# Altium footprint library ICs.PcbLib: 29 footprints (part 1 of 2)
Each footprint in its own frame and in the unit in brackets; x right, y up, seen from the top. Pads: shape width x height; smd on the part's side, far side on the other; paste and mask are expansions set on the pad; w line width, h text height; cw(c..) or ccw(c..) is an arc to the next point about the centre after c.
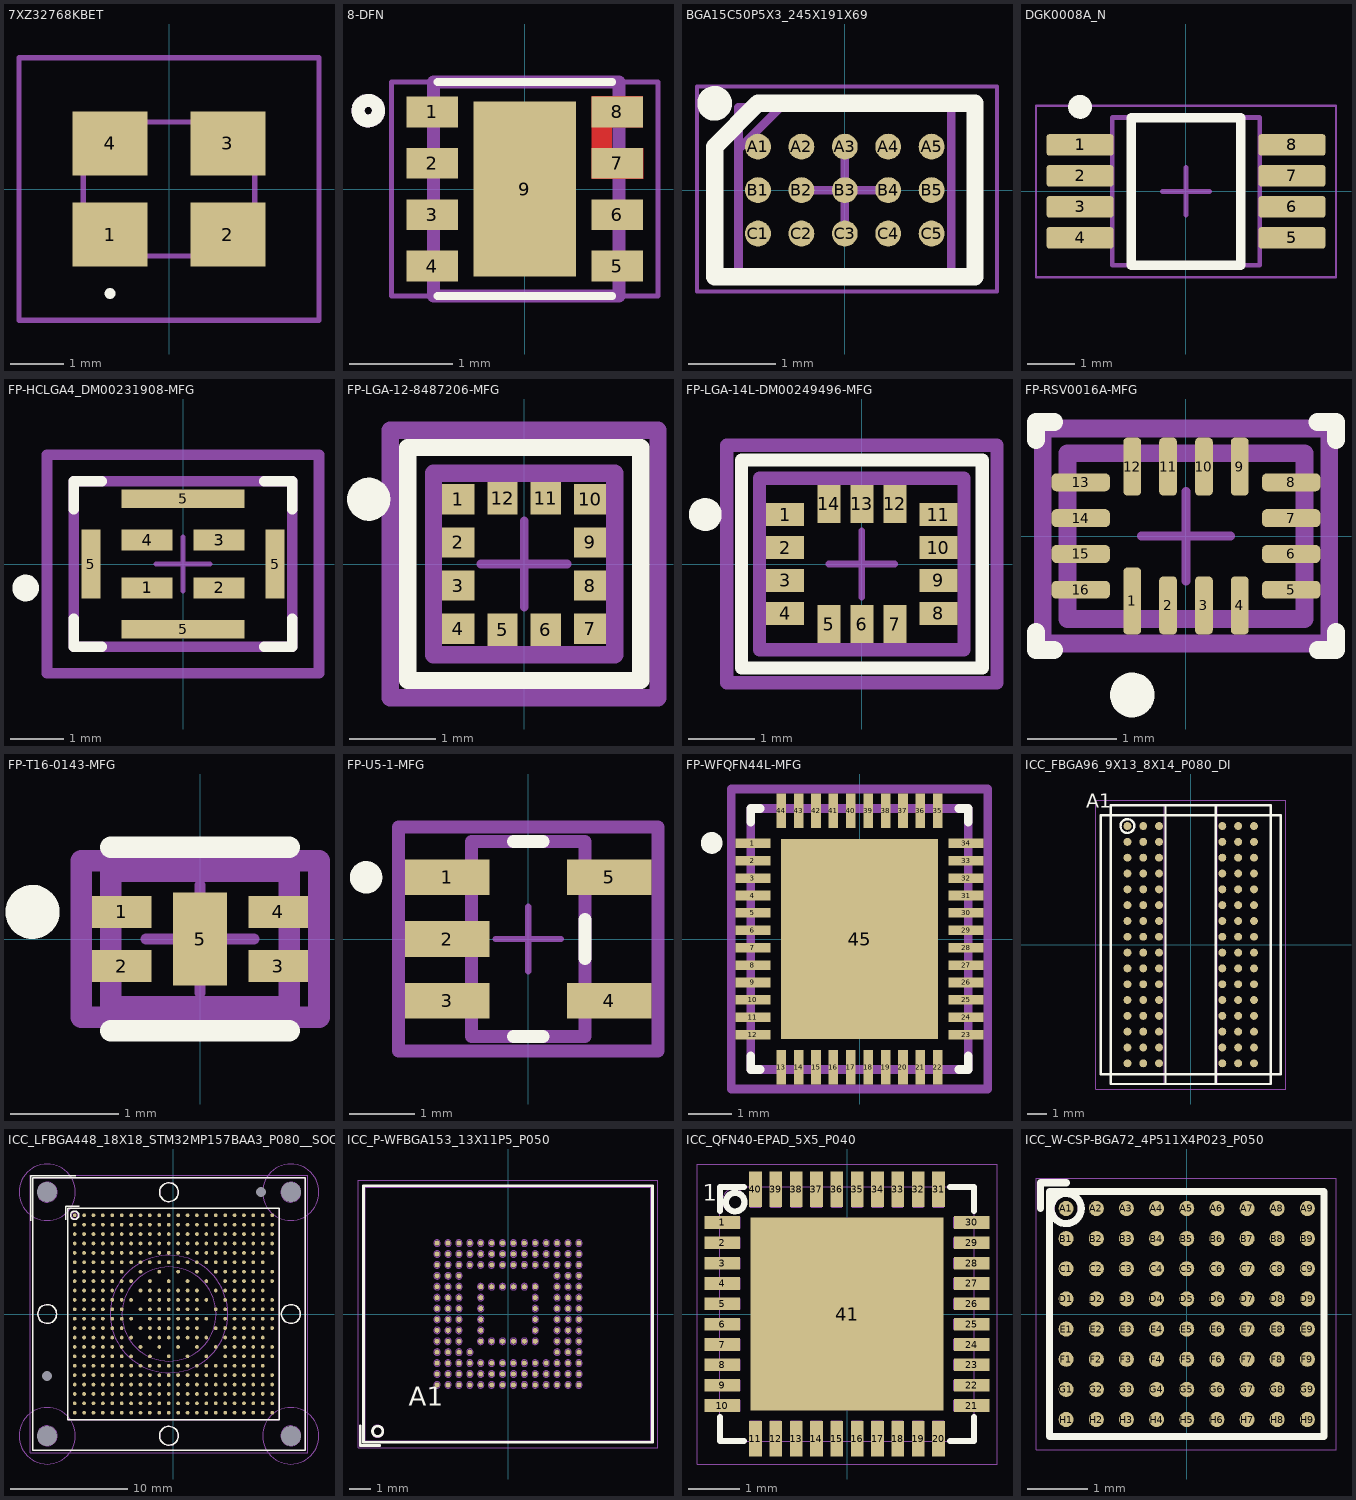
[diagram p0: the footprints below, top view; thin cyan lines are the x and y axes]

## 7XZ32768KBET [mm]
pads (4):
  rect 1.4x1.2 smd: 1(-1.1,-0.85) 2(1.1,-0.85) 3(1.1,0.85) 4(-1.1,0.85)
Top Overlay:
  lines w0.1: -1.1,-2 ccw(c-1.1,-1.95) -1.1,-1.9 ccw(c-1.1,-1.95) -1.1,-2
Mechanical 13:
  lines w0.1: -1.6,-1.25 1.6,-1.25 1.6,1.25 -1.6,1.25 -1.6,-1.25
Mechanical 15:
  lines w0.1: -2.8,-2.45 2.8,-2.45 2.8,2.45 -2.8,2.45 -2.8,-2.45
3D body "7XZ-32.768KBE-T.stp": height 1.2, standoff 0, extent -1.68,-1.33 1.68,1.33

## 8-DFN [mm]
pads (9):
  rect 0.5x0.3 smd mask+0.05: 1(-0.9,0.75) 2(-0.9,0.25) 3(-0.9,-0.25) 4(-0.9,-0.75) 5(0.9,-0.75) 6(0.9,-0.25) 7(0.9,0.25) 8(0.9,0.75)
  rect 1x1.7 smd paste-2 mask+0.05: 9(0,0)
Top Layer:
  region: 1.149,0.9 1.149,0.599 0.847,0.599 0.847,0.398 1.15,0.398 1.15,0.102 0.65,0.102 0.65,0.9
Top Overlay:
  circle w0.127: c-1.522,0.762 r0.1
  lines w0.075: -0.85,-1.04 0.85,-1.04 ; -0.85,1.04 0.85,1.04
Mechanical 13:
  circle w0.127: c-1.522,0.762 r0.1
  lines w0.127: -0.889,-1.041 0.914,-1.041 0.914,1.041 -0.889,1.041 -0.889,-1.041
Mechanical 15:
  lines w0.05: -1.295,-1.041 -1.295,1.041 1.295,1.041 1.295,-1.041 -1.295,-1.041
3D body "DFN-8.STEP": height 1.01, standoff 0.01, extent -0.984,-1.001 1.016,0.999

## BGA15C50P5X3_245X191X69 [mm]
pads (15):
  round 0.298 smd mask+0.051: A1(-1,0.5) A2(-0.5,0.5) A3(0,0.5) A4(0.5,0.5) A5(1,0.5) B1(-1,0) B2(-0.5,0) B3(0,0) B4(0.5,0) B5(1,0) C1(-1,-0.5) C2(-0.5,-0.5) C3(0,-0.5) C4(0.5,-0.5) C5(1,-0.5)
Top Overlay:
  circle w0.2: c-1.499,0.999 r0.1
  lines w0.2: -1.499,-0.999 -1.499,0.5 -1,0.999 1.499,0.999 1.499,-0.999 -1.499,-0.999
Top Courtyard:
  lines w0.05: -1.702,-1.168 -1.702,1.194 1.753,1.194 1.753,-1.168 -1.702,-1.168
Top Component Center:
  lines w0.1: -0.5,0 0.5,0 ; 0,-0.5 0,0.5
Top Assembly:
  lines w0.1: -1.224,0.471 -0.741,0.954 ; -1.224,-0.954 -1.224,0.954 1.224,0.954 1.224,-0.954 -1.224,-0.954
  text ".Designator" at 0,0.188 h1
3D body "MAX17330X22+.stp": height 0.69, standoff 0, extent -1.224,-0.954 1.224,0.954

## DGK0008A_N [mm] "TSOP, 8-Leads, Body 3.1x3.1mm, Pitch 0.65mm, IPC Medium Density"
height 1.1
pads (8):
  rrect22% 1.4x0.45 smd mask+0.051: 1(-2.225,0.975) 2(-2.225,0.325) 3(-2.225,-0.325) 4(-2.225,-0.975) 5(2.225,-0.975) 6(2.225,-0.325) 7(2.225,0.325) 8(2.225,0.975)
Top Overlay:
  circle w0.25: c-2.225,1.775 r0.125
  lines w0.2: -1.15,-1.55 1.15,-1.55 1.15,1.55 -1.15,1.55 -1.15,-1.55
Mechanical 1:
  text ".Designator" at -1.397,-0.254 h0.7
Mechanical 13:
  lines w0.1: -1.55,-1.55 1.55,-1.55 1.55,1.55 -1.55,1.55 -1.55,-1.55
Mechanical 15:
  lines w0.05: -3.15,-1.8 3.15,-1.8 3.15,1.8 -3.15,1.8 -3.15,-1.8
  lines w0.1: -0.5,0 0.5,0 ; 0,-0.5 0,0.5
3D body "MUY08A_ASM.stp": height 0.94, standoff -0.02, extent -2.451,-1.499 2.451,1.499

## FP-HCLGA4_DM00231908-MFG [mm]
pads (8):
  rect 0.95x0.4 smd paste+0 mask+0.102: 1(-0.675,-0.45) 2(0.675,-0.45) 3(0.675,0.45) 4(-0.675,0.45)
  rect 0.35x1.3 smd paste+0 mask+0.102: 5(-1.725,0) 5(1.725,0)
  rect 2.3x0.35 smd paste+0 mask+0.102: 5(0,-1.225) 5(0,1.225)
Top Overlay:
  circle w0.25: c-2.95,-0.45 r0.125
  lines w0.2: -2.05,-1.025 -2.05,-1.55 -1.525,-1.55 ; -2.05,1.025 -2.05,1.55 -1.525,1.55 ; 1.525,-1.55 2.05,-1.55 2.05,-1.025 ; 1.525,1.55 2.05,1.55 2.05,1.025
Top Courtyard:
  lines w0.2: -2.55,-2.05 2.55,-2.05 2.55,2.05 -2.55,2.05 -2.55,-2.05
Top Component Center:
  lines w0.1: -0.5,0 0.5,0 ; 0,-0.5 0,0.5
Top 3D Body:
  lines w0.2: -2.05,-1.55 2.05,-1.55 2.05,1.55 -2.05,1.55 -2.05,-1.55
Top Assembly:
  lines w0.2: -2.55,-2.05 2.55,-2.05 2.55,2.05 -2.55,2.05 -2.55,-2.05
  text ".Designator" at 0,0.188 h1
3D body "IC_STMicroelectronics_IMP34DT05TR_eec.STEP": height 0.25, standoff 0, extent -2.55,-2.05 2.55,2.05

## FP-LGA-12-8487206-MFG [mm]
pads (12):
  rect 0.375x0.35 smd paste+0 mask+0.025: 1(-0.763,0.75) 2(-0.763,0.25) 3(-0.763,-0.25) 4(-0.763,-0.75) 7(0.763,-0.75) 8(0.763,-0.25) 9(0.763,0.25) 10(0.763,0.75)
  rect 0.35x0.375 smd paste+0 mask+0.025: 5(-0.25,-0.763) 6(0.25,-0.763) 11(0.25,0.763) 12(-0.25,0.763)
Top Overlay:
  circle w0.25: c-1.8,0.75 r0.125
  lines w0.2: -1.35,-1.35 1.35,-1.35 1.35,1.35 -1.35,1.35 -1.35,-1.35
Top Courtyard:
  lines w0.2: -1.55,-1.55 1.55,-1.55 1.55,1.55 -1.55,1.55 -1.55,-1.55
Top Component Center:
  lines w0.1: -0.5,0 0.5,0 ; 0,-0.5 0,0.5
Top 3D Body:
  lines w0.2: -1.05,-1.05 1.05,-1.05 1.05,1.05 -1.05,1.05 -1.05,-1.05
Top Assembly:
  lines w0.2: -1.55,-1.55 1.55,-1.55 1.55,1.55 -1.55,1.55 -1.55,-1.55
  text ".Designator" at 0,0.188 h1
3D body "IC_STMicroelectronics_LSM303AGRTR_eec.STEP": height 0.25, standoff 0, extent -1.55,-1.55 1.55,1.55

## FP-LGA-14L-DM00249496-MFG [mm]
pads (14):
  rect 0.575x0.35 smd paste+0 mask+0.025: 1(-1.162,0.75) 2(-1.162,0.25) 3(-1.162,-0.25) 4(-1.162,-0.75) 8(1.162,-0.75) 9(1.162,-0.25) 10(1.162,0.25) 11(1.162,0.75)
  rect 0.35x0.575 smd paste+0 mask+0.025: 5(-0.5,-0.913) 6(0,-0.913) 7(0.5,-0.913) 12(0.5,0.913) 13(0,0.913) 14(-0.5,0.913)
Top Overlay:
  circle w0.25: c-2.375,0.75 r0.125
  lines w0.2: -1.825,-1.575 -1.825,1.575 1.825,1.575 1.825,-1.575 -1.825,-1.575
Top Courtyard:
  lines w0.2: -2.05,-1.8 -2.05,1.8 2.05,1.8 2.05,-1.8 -2.05,-1.8
Top Component Center:
  lines w0.1: -0.5,0 0.5,0 ; 0,-0.5 0,0.5
Top 3D Body:
  lines w0.2: -1.55,-1.3 -1.55,1.3 1.55,1.3 1.55,-1.3 -1.55,-1.3
Top Assembly:
  lines w0.2: -2.05,-1.8 -2.05,1.8 2.05,1.8 2.05,-1.8 -2.05,-1.8
  text ".Designator" at 0,0.188 h1
3D body "IC_STMicroelectronics_LSM6DSMTR_eec.STEP": height 0.25, standoff 0, extent -2.05,-1.8 2.05,1.8

## FP-RSV0016A-MFG [mm]
pads (16):
  rrect50% 0.2x0.75 smd paste+0 mask+0.025: 1(-0.6,-0.725)
  rrect50% 0.2x0.65 smd paste+0 mask+0.025: 2(-0.2,-0.775) 3(0.2,-0.775) 4(0.6,-0.775) 9(0.6,0.775) 10(0.2,0.775) 11(-0.2,0.775) 12(-0.6,0.775)
  rrect50% 0.65x0.2 smd paste+0 mask+0.025: 5(1.175,-0.6) 6(1.175,-0.2) 7(1.175,0.2) 8(1.175,0.6) 13(-1.175,0.6) 14(-1.175,0.2) 15(-1.175,-0.2) 16(-1.175,-0.6)
Top Overlay:
  circle w0.25: c-0.6,-1.775 r0.125
  lines w0.2: -1.675,-1.273 -1.475,-1.273 ; -1.675,-1.27 -1.675,-1.07 ; -1.675,1.074 -1.675,1.274 ; -1.672,1.275 -1.472,1.275 ; 1.469,1.275 1.669,1.275 ; 1.471,-1.274 1.671,-1.274 ; 1.674,1.072 1.674,1.272 ; 1.675,-1.274 1.675,-1.074
Top Courtyard:
  lines w0.2: -1.6,-1.2 -1.6,1.2 1.6,1.2 1.6,-1.2 -1.6,-1.2
Top Component Center:
  lines w0.1: -0.5,0 0.5,0 ; 0,-0.5 0,0.5
Top 3D Body:
  lines w0.2: -1.325,-0.925 -1.325,0.925 1.325,0.925 1.325,-0.925 -1.325,-0.925
Top Assembly:
  lines w0.2: -1.6,-1.2 -1.6,1.2 1.6,1.2 1.6,-1.2 -1.6,-1.2
  text ".Designator" at -2.261,1.636 h1
3D body "IC_Texas_Instruments_TMUX1108RSVR_eec.STEP": height 0.25, standoff 0, extent -1.6,-1.2 1.6,1.2

## FP-T16-0143-MFG [mm]
pads (5):
  rect 0.55x0.3 smd paste+0 mask+0.025: 1(-0.725,0.25) 2(-0.725,-0.25) 3(0.725,-0.25) 4(0.725,0.25)
  rect 0.5x0.86 smd paste+0 mask+0.025: 5(0,0)
Top Overlay:
  circle w0.25: c-1.55,0.25 r0.125
  lines w0.2: -0.825,-0.85 0.825,-0.85 ; -0.825,0.85 0.825,0.85
Top Courtyard:
  lines w0.2: -1.1,-0.725 1.1,-0.725 1.1,0.725 -1.1,0.725 -1.1,-0.725
Top Component Center:
  lines w0.1: -0.5,0 0.5,0 ; 0,-0.5 0,0.5
Top 3D Body:
  lines w0.2: -0.825,-0.625 0.825,-0.625 0.825,0.625 -0.825,0.625 -0.825,-0.625
Top Assembly:
  lines w0.2: -1.1,-0.725 1.1,-0.725 1.1,0.725 -1.1,0.725 -1.1,-0.725
  text ".Designator" at 0,-0.001 h1
3D body "IC_Vishay_SIP32408DNP-T1-GE4_eec.STEP": height 0.25, standoff 0, extent -1.1,-0.725 1.1,0.725

## FP-U5-1-MFG [mm]
pads (5):
  rect 1.3x0.55 smd paste+0 mask+0.102: 1(-1.25,0.95) 2(-1.25,0) 3(-1.25,-0.95) 4(1.25,-0.95) 5(1.25,0.95)
Top Overlay:
  circle w0.25: c-2.5,0.95 r0.125
  lines w0.2: -0.225,-1.5 0.225,-1.5 ; -0.225,1.5 0.225,1.5 ; 0.875,-0.3 0.875,0.3
Top Courtyard:
  lines w0.2: -2,-1.725 2,-1.725 2,1.725 -2,1.725 -2,-1.725
Top Component Center:
  lines w0.1: -0.5,0 0.5,0 ; 0,-0.5 0,0.5
Top 3D Body:
  lines w0.2: -0.875,-1.5 0.875,-1.5 0.875,1.5 -0.875,1.5 -0.875,-1.5
Top Assembly:
  lines w0.2: -2,-1.725 2,-1.725 2,1.725 -2,1.725 -2,-1.725
  text ".Designator" at 0,-0.001 h1
3D body "IC_Maxim_Integrated_MAX9031AUK+T_eec.STEP": height 0.25, standoff 0, extent -2,-1.725 2,1.725

## FP-WFQFN44L-MFG [mm]
pads (45):
  rect 0.8x0.22 smd paste+0 mask+0: 1(-2.45,2.2) 2(-2.45,1.8) 3(-2.45,1.4) 4(-2.45,1) 5(-2.45,0.6) 6(-2.45,0.2) 7(-2.45,-0.2) 8(-2.45,-0.6) 9(-2.45,-1) 10(-2.45,-1.4) 11(-2.45,-1.8) 12(-2.45,-2.2) 23(2.45,-2.2) 24(2.45,-1.8) 25(2.45,-1.4) 26(2.45,-1) 27(2.45,-0.6) 28(2.45,-0.2) 29(2.45,0.2) 30(2.45,0.6) 31(2.45,1) 32(2.45,1.4) 33(2.45,1.8) 34(2.45,2.2)
  rect 0.22x0.8 smd paste+0 mask+0: 13(-1.8,-2.95) 14(-1.4,-2.95) 15(-1,-2.95) 16(-0.6,-2.95) 17(-0.2,-2.95) 18(0.2,-2.95) 19(0.6,-2.95) 20(1,-2.95) 21(1.4,-2.95) 22(1.8,-2.95) 35(1.8,2.95) 36(1.4,2.95) 37(1,2.95) 38(0.6,2.95) 39(0.2,2.95) 40(-0.2,2.95) 41(-0.6,2.95) 42(-1,2.95) 43(-1.4,2.95) 44(-1.8,2.95)
  rect 3.6x4.6 smd paste+0 mask+0: 45(0,0)
Top Overlay:
  circle w0.25: c-3.4,2.21 r0.125
  lines w0.2: -2.5,-2.685 -2.5,-3 -2.285,-3 ; -2.5,2.685 -2.5,3 -2.285,3 ; 2.285,-3 2.5,-3 2.5,-2.685 ; 2.285,3 2.5,3 2.5,2.685
Top Courtyard:
  lines w0.2: -2.95,-3.45 -2.95,3.45 2.95,3.45 2.95,-3.45 -2.95,-3.45
Top Component Center:
  lines w0.1: -0.5,0 0.5,0 ; 0,-0.5 0,0.5
Top 3D Body:
  lines w0.2: -2.5,-3 -2.5,3 2.5,3 2.5,-3 -2.5,-3
Top Assembly:
  lines w0.2: -2.95,-3.45 -2.95,3.45 2.95,3.45 2.95,-3.45 -2.95,-3.45
  text ".Designator" at 0,0.188 h1
3D body "IC_STMicroelectronics_STPMIC1APQR_eec.STEP": height 0.25, standoff 0, extent -2.95,-3.45 2.95,3.45

## ICC_FBGA96_9X13_8X14_P080_DI [mm]
pads (96):
  round 0.4 smd mask+0.05: A1(-3.2,6) A2(-2.4,6) A3(-1.6,6) A7(1.6,6) A8(2.4,6) A9(3.2,6) B1(-3.2,5.2) B2(-2.4,5.2) B3(-1.6,5.2) B7(1.6,5.2) B8(2.4,5.2) B9(3.2,5.2) C1(-3.2,4.4) C2(-2.4,4.4) C3(-1.6,4.4) C7(1.6,4.4) C8(2.4,4.4) C9(3.2,4.4) D1(-3.2,3.6) D2(-2.4,3.6) D3(-1.6,3.6) D7(1.6,3.6) D8(2.4,3.6) D9(3.2,3.6) E1(-3.2,2.8) E2(-2.4,2.8) E3(-1.6,2.8) E7(1.6,2.8) E8(2.4,2.8) E9(3.2,2.8) F1(-3.2,2) F2(-2.4,2) F3(-1.6,2) F7(1.6,2) F8(2.4,2) F9(3.2,2) G1(-3.2,1.2) G2(-2.4,1.2) G3(-1.6,1.2) G7(1.6,1.2) G8(2.4,1.2) G9(3.2,1.2) H1(-3.2,0.4) H2(-2.4,0.4) H3(-1.6,0.4) H7(1.6,0.4) H8(2.4,0.4) H9(3.2,0.4) J1(-3.2,-0.4) J2(-2.4,-0.4) J3(-1.6,-0.4) J7(1.6,-0.4) J8(2.4,-0.4) J9(3.2,-0.4) K1(-3.2,-1.2) K2(-2.4,-1.2) K3(-1.6,-1.2) K7(1.6,-1.2) K8(2.4,-1.2) K9(3.2,-1.2) L1(-3.2,-2) L2(-2.4,-2) L3(-1.6,-2) L7(1.6,-2) L8(2.4,-2) L9(3.2,-2) M1(-3.2,-2.8) M2(-2.4,-2.8) M3(-1.6,-2.8) M7(1.6,-2.8) M8(2.4,-2.8) M9(3.2,-2.8) N1(-3.2,-3.6) N2(-2.4,-3.6) N3(-1.6,-3.6) N7(1.6,-3.6) N8(2.4,-3.6) N9(3.2,-3.6) P1(-3.2,-4.4) P2(-2.4,-4.4) P3(-1.6,-4.4) P7(1.6,-4.4) P8(2.4,-4.4) P9(3.2,-4.4) R1(-3.2,-5.2) R2(-2.4,-5.2) R3(-1.6,-5.2) R7(1.6,-5.2) R8(2.4,-5.2) R9(3.2,-5.2) T1(-3.2,-6) T2(-2.4,-6) T3(-1.6,-6) T7(1.6,-6) T8(2.4,-6) T9(3.2,-6)
Top Overlay:
  lines w0.12: -2.851,6.023 ccw(c-3.2,6) -2.85,6 ; -1.275,-7.05 -1.275,7.05 ; 1.275,-7.05 1.275,7.05 ; -4.55,-6.55 -4.55,6.55 4.55,6.55 4.55,-6.55 -4.55,-6.55 ; -4.05,-7.05 4.05,-7.05 4.05,7.05 -4.05,7.05 -4.05,-7.05
  text "A1" at -5.275,6.675 h1.2
Mechanical 14:
  circle w0.01: c-3.2,6 r0.35
  lines w0.01: -1.35,-7.05 -1.35,7.05 ; 1.35,-7.05 1.35,7.05 ; -4.55,-6.55 -4.55,6.55 4.55,6.55 4.55,-6.55 -4.55,-6.55 ; -4.05,-7.05 4.05,-7.05 4.05,7.05 -4.05,7.05 -4.05,-7.05
  text "A1" at -3.575,5.775 h0.75
  text "8 x 14" at -4.025,6.625 h0.6
  text "9 x 13" at -4.15,-6.5 h0.6
  text "'.Designator'" at -2,-0.5 h0.75
Top Component Center:
  lines w0.01: -4.8,-7.3 4.8,-7.3 4.8,7.3 -4.8,7.3 -4.8,-7.3
3D body: height 1.2, standoff 0, extent -4.05,-7.05 4.05,7.05
3D body: height 1, standoff 0, extent -4.55,-6.55 4.55,6.55

## ICC_LFBGA448_18X18_STM32MP157BAA3_P080__SOCKET_IE_CS1627194MF [mm]
pads (454):
  round 0.32 smd mask+0.05: A1(-8.4,8.4) A2(-7.6,8.4) A3(-6.8,8.4) A4(-6,8.4) A5(-5.2,8.4) A6(-4.4,8.4) A7(-3.6,8.4) A8(-2.8,8.4) A9(-2,8.4) A10(-1.2,8.4) A11(-0.4,8.4) A12(0.4,8.4) A13(1.2,8.4) A14(2,8.4) A15(2.8,8.4) A16(3.6,8.4) A17(4.4,8.4) A18(5.2,8.4) A19(6,8.4) A20(6.8,8.4) A21(7.6,8.4) A22(8.4,8.4) AA1(-8.4,-7.6) AA2(-7.6,-7.6) AA3(-6.8,-7.6) AA4(-6,-7.6) AA5(-5.2,-7.6) AA6(-4.4,-7.6) AA7(-3.6,-7.6) AA8(-2.8,-7.6) AA9(-2,-7.6) AA10(-1.2,-7.6) AA11(-0.4,-7.6) AA12(0.4,-7.6) AA13(1.2,-7.6) AA14(2,-7.6) AA15(2.8,-7.6) AA16(3.6,-7.6) AA17(4.4,-7.6) AA18(5.2,-7.6) AA19(6,-7.6) AA20(6.8,-7.6) AA21(7.6,-7.6) AA22(8.4,-7.6) AB1(-8.4,-8.4) AB2(-7.6,-8.4) AB3(-6.8,-8.4) AB4(-6,-8.4) AB5(-5.2,-8.4) AB6(-4.4,-8.4) AB7(-3.6,-8.4) AB8(-2.8,-8.4) AB9(-2,-8.4) AB10(-1.2,-8.4) AB11(-0.4,-8.4) AB12(0.4,-8.4) AB13(1.2,-8.4) AB14(2,-8.4) AB15(2.8,-8.4) AB16(3.6,-8.4) AB17(4.4,-8.4) AB18(5.2,-8.4) AB19(6,-8.4) AB20(6.8,-8.4) AB21(7.6,-8.4) AB22(8.4,-8.4) B1(-8.4,7.6) B2(-7.6,7.6) B3(-6.8,7.6) B4(-6,7.6) B5(-5.2,7.6) B6(-4.4,7.6) B7(-3.6,7.6) B8(-2.8,7.6) B9(-2,7.6) B10(-1.2,7.6) B11(-0.4,7.6) B12(0.4,7.6) B13(1.2,7.6) B14(2,7.6) B15(2.8,7.6) B16(3.6,7.6) B17(4.4,7.6) B18(5.2,7.6) B19(6,7.6) B20(6.8,7.6) B21(7.6,7.6) B22(8.4,7.6) C1(-8.4,6.8) C2(-7.6,6.8) C3(-6.8,6.8) C4(-6,6.8) C5(-5.2,6.8) C6(-4.4,6.8) C7(-3.6,6.8) C8(-2.8,6.8) C9(-2,6.8) C10(-1.2,6.8) C11(-0.4,6.8) C12(0.4,6.8) C13(1.2,6.8) C14(2,6.8) C15(2.8,6.8) C16(3.6,6.8) C17(4.4,6.8) C18(5.2,6.8) C19(6,6.8) C20(6.8,6.8) C21(7.6,6.8) C22(8.4,6.8) D1(-8.4,6) D2(-7.6,6) D3(-6.8,6) D4(-6,6) D5(-5.2,6) D6(-4.4,6) D7(-3.6,6) D8(-2.8,6) D9(-2,6) D10(-1.2,6) D11(-0.4,6) D12(0.4,6) D13(1.2,6) D14(2,6) D15(2.8,6) D16(3.6,6) D17(4.4,6) D18(5.2,6) D19(6,6) D20(6.8,6) D21(7.6,6) D22(8.4,6) E1(-8.4,5.2) E2(-7.6,5.2) E3(-6.8,5.2) E4(-6,5.2) E5(-5.2,5.2) E6(-4.4,5.2) E7(-3.6,5.2) E8(-2.8,5.2) E9(-2,5.2) E10(-1.2,5.2) E11(-0.4,5.2) E12(0.4,5.2) E13(1.2,5.2) E14(2,5.2) E15(2.8,5.2) E16(3.6,5.2) E17(4.4,5.2) E18(5.2,5.2) E19(6,5.2) E20(6.8,5.2) E21(7.6,5.2) E22(8.4,5.2) F1(-8.4,4.4) F2(-7.6,4.4) F3(-6.8,4.4) F4(-6,4.4) F5(-5.2,4.4) F6(-4.4,4.4) F7(-3.6,4.4) F8(-2.8,4.4) F9(-2,4.4) F10(-1.2,4.4) F11(-0.4,4.4) F12(0.4,4.4) F13(1.2,4.4) F14(2,4.4) F15(2.8,4.4) F16(3.6,4.4) F17(4.4,4.4) F18(5.2,4.4) F19(6,4.4) F20(6.8,4.4) F21(7.6,4.4) G1(-8.4,3.6) G2(-7.6,3.6) G3(-6.8,3.6) G4(-6,3.6) G5(-5.2,3.6) G6(-4.4,3.6) G8(-2.8,3.6) G10(-1.2,3.6) G12(0.4,3.6) G14(2,3.6) G16(3.6,3.6) G17(4.4,3.6) G18(5.2,3.6) G19(6,3.6) G20(6.8,3.6) G21(7.6,3.6) G22(8.4,3.6) H1(-8.4,2.8) H2(-7.6,2.8) H3(-6.8,2.8) H4(-6,2.8) H5(-5.2,2.8) H6(-4.4,2.8) H7(-3.6,2.8) H9(-2,2.8) H11(-0.4,2.8) H13(1.2,2.8) H15(2.8,2.8) H17(4.4,2.8) H18(5.2,2.8) H19(6,2.8) H20(6.8,2.8) H21(7.6,2.8) H22(8.4,2.8) J1(-8.4,2) J2(-7.6,2) J3(-6.8,2) J4(-6,2) J5(-5.2,2) J6(-4.4,2) J8(-2.8,2) J9(-2,2) J10(-1.2,2) J11(-0.4,2) J12(0.4,2) J13(1.2,2) J14(2,2) J16(3.6,2) J17(4.4,2) J18(5.2,2) J19(6,2) J20(6.8,2) J21(7.6,2) K1(-8.4,1.2) K2(-7.6,1.2) K3(-6.8,1.2) K4(-6,1.2) K5(-5.2,1.2) K6(-4.4,1.2) K7(-3.6,1.2) K9(-2,1.2) K10(-1.2,1.2) K11(-0.4,1.2) K12(0.4,1.2) K13(1.2,1.2) K14(2,1.2) K15(2.8,1.2) K17(4.4,1.2) K18(5.2,1.2) K19(6,1.2) K20(6.8,1.2) K21(7.6,1.2) K22(8.4,1.2) L1(-8.4,0.4) L2(-7.6,0.4) L3(-6.8,0.4) L4(-6,0.4) L5(-5.2,0.4) L6(-4.4,0.4) L8(-2.8,0.4) L9(-2,0.4) L10(-1.2,0.4) L11(-0.4,0.4) L12(0.4,0.4) L13(1.2,0.4) L14(2,0.4) L16(3.6,0.4) L17(4.4,0.4) L18(5.2,0.4) L19(6,0.4) L20(6.8,0.4) L21(7.6,0.4) L22(8.4,0.4) M1(-8.4,-0.4) M2(-7.6,-0.4) M3(-6.8,-0.4) M4(-6,-0.4) M5(-5.2,-0.4) M6(-4.4,-0.4) M7(-3.6,-0.4) M9(-2,-0.4) M10(-1.2,-0.4) M11(-0.4,-0.4) M12(0.4,-0.4) M13(1.2,-0.4) M14(2,-0.4) M15(2.8,-0.4) M17(4.4,-0.4) M18(5.2,-0.4) M19(6,-0.4) M20(6.8,-0.4) M21(7.6,-0.4) M22(8.4,-0.4) N1(-8.4,-1.2) N2(-7.6,-1.2) N3(-6.8,-1.2) N4(-6,-1.2) N5(-5.2,-1.2) N6(-4.4,-1.2) N8(-2.8,-1.2) N9(-2,-1.2) N10(-1.2,-1.2) N11(-0.4,-1.2) N12(0.4,-1.2) N13(1.2,-1.2) N14(2,-1.2) N16(3.6,-1.2) N17(4.4,-1.2) N18(5.2,-1.2) N19(6,-1.2) N20(6.8,-1.2) N21(7.6,-1.2) N22(8.4,-1.2) P1(-8.4,-2) P2(-7.6,-2) P3(-6.8,-2) P4(-6,-2) P5(-5.2,-2) P6(-4.4,-2) P7(-3.6,-2) P9(-2,-2) P10(-1.2,-2) P11(-0.4,-2) P12(0.4,-2) P13(1.2,-2) P14(2,-2) P15(2.8,-2) P17(4.4,-2) P18(5.2,-2) P19(6,-2) P20(6.8,-2) P21(7.6,-2) R1(-8.4,-2.8) R2(-7.6,-2.8) R3(-6.8,-2.8) R4(-6,-2.8) R5(-5.2,-2.8) R6(-4.4,-2.8) R8(-2.8,-2.8) R10(-1.2,-2.8) R12(0.4,-2.8) R14(2,-2.8) R16(3.6,-2.8) R17(4.4,-2.8) R18(5.2,-2.8) R19(6,-2.8) R20(6.8,-2.8) R21(7.6,-2.8) R22(8.4,-2.8) T1(-8.4,-3.6) T2(-7.6,-3.6) T3(-6.8,-3.6) T4(-6,-3.6) T5(-5.2,-3.6) T6(-4.4,-3.6) T7(-3.6,-3.6) T9(-2,-3.6) T11(-0.4,-3.6) T13(1.2,-3.6) T15(2.8,-3.6) T17(4.4,-3.6) T18(5.2,-3.6) T19(6,-3.6) T20(6.8,-3.6) T21(7.6,-3.6) T22(8.4,-3.6) U1(-8.4,-4.4) U2(-7.6,-4.4) U3(-6.8,-4.4) U4(-6,-4.4) U5(-5.2,-4.4) U6(-4.4,-4.4) U7(-3.6,-4.4) U8(-2.8,-4.4) U9(-2,-4.4) U10(-1.2,-4.4) U11(-0.4,-4.4) U12(0.4,-4.4) U13(1.2,-4.4) U14(2,-4.4) U15(2.8,-4.4) U16(3.6,-4.4) U17(4.4,-4.4) U18(5.2,-4.4) U19(6,-4.4) U20(6.8,-4.4) U21(7.6,-4.4) V1(-8.4,-5.2) V2(-7.6,-5.2) V3(-6.8,-5.2) V4(-6,-5.2) V5(-5.2,-5.2) V6(-4.4,-5.2) V7(-3.6,-5.2) V8(-2.8,-5.2) V9(-2,-5.2) V10(-1.2,-5.2) V11(-0.4,-5.2) V12(0.4,-5.2) V13(1.2,-5.2) V14(2,-5.2) V15(2.8,-5.2) V16(3.6,-5.2) V17(4.4,-5.2) V18(5.2,-5.2) V19(6,-5.2) V20(6.8,-5.2) V21(7.6,-5.2) V22(8.4,-5.2) W1(-8.4,-6) W2(-7.6,-6) W3(-6.8,-6) W4(-6,-6) W5(-5.2,-6) W6(-4.4,-6) W7(-3.6,-6) W8(-2.8,-6) W9(-2,-6) W10(-1.2,-6) W11(-0.4,-6) W12(0.4,-6) W13(1.2,-6) W14(2,-6) W15(2.8,-6) W16(3.6,-6) W17(4.4,-6) W18(5.2,-6) W19(6,-6) W20(6.8,-6) W21(7.6,-6) W22(8.4,-6) Y1(-8.4,-6.8) Y2(-7.6,-6.8) Y3(-6.8,-6.8) Y4(-6,-6.8) Y5(-5.2,-6.8) Y6(-4.4,-6.8) Y7(-3.6,-6.8) Y8(-2.8,-6.8) Y9(-2,-6.8) Y10(-1.2,-6.8) Y11(-0.4,-6.8) Y12(0.4,-6.8) Y13(1.2,-6.8) Y14(2,-6.8) Y15(2.8,-6.8) Y16(3.6,-6.8) Y17(4.4,-6.8) Y18(5.2,-6.8) Y19(6,-6.8) Y20(6.8,-6.8) Y21(7.6,-6.8) Y22(8.4,-6.8)
  round 0.5 hole 1.7 unplated mask+0.05: NPTH1(-10.737,10.362) NPTH2(9.987,10.362) NPTH3(-10.737,-10.362) NPTH4(9.987,-10.362)
  round 0.5 hole 0.85 unplated mask+0.05: NPTH5(-10.737,-5.282) NPTH6(7.447,10.362)
Top Overlay:
  circle w0.12: c-8.4,8.4 r0.35
  circle w0.12: c-0.375,10.362 r0.8
  circle w0.12: c-0.375,-10.362 r0.8
  circle w0.12: c9.987,0 r0.8
  circle w0.12: c-10.737,0 r0.8
  lines w0.12: -12.125,7.95 -12.125,11.75 -8.325,11.75 ; -9.15,8 -9.15,9.15 -8,9.15 ; -11.987,-11.613 -11.987,11.612 11.238,11.612 11.238,-11.613 -11.987,-11.613 ; -9,-9 -9,9 9,9 9,-9 -9,-9
Bottom Overlay:
  circle w0.12: c-10.737,-10.362 r2.4
  circle w0.12: c-10.737,10.362 r2.4
  circle w0.12: c9.987,10.362 r2.4
  circle w0.12: c9.987,-10.362 r2.4
  circle w0.12: c-10.737,-10.362 r1
  circle w0.12: c-10.737,10.362 r1
  circle w0.12: c9.987,10.362 r1
  circle w0.12: c9.987,-10.362 r1
Mechanical 14:
  circle w0.01: c-0.375,10.362 r0.8
  circle w0.01: c-0.375,-10.362 r0.8
  circle w0.01: c9.987,0 r0.8
  circle w0.01: c-10.737,0 r0.8
  circle w0.01: c-8.4,8.4 r0.275
  circle w0.01: c-0.375,0 r4
  circle w0.01: c-0.375,0 r5
  lines w0.01: -11.987,-11.613 -11.987,11.612 11.238,11.612 11.238,-11.613 -11.987,-11.613 ; -9,-9 -9,9 9,9 9,-9 -9,-9
  text "'.Designator'" at -2,-0.5 h0.75
  text "A1" at -8.65,8.225 h0.4
Mechanical 15:
  circle w0.01: c-10.737,-10.362 r2.4
  circle w0.01: c-10.737,10.362 r2.4
  circle w0.01: c9.987,10.362 r2.4
  circle w0.01: c9.987,-10.362 r2.4
  circle w0.01: c-10.737,-10.362 r0.85
  circle w0.01: c-10.737,10.362 r0.85
  circle w0.01: c9.987,10.362 r0.85
  circle w0.01: c9.987,-10.362 r0.85
Top Component Center:
  lines w0.01: -12.2,-11.825 -12.2,11.825 11.45,11.825 11.45,-11.825 -12.2,-11.825
3D body: height 7, standoff 0, extent -11.987,-11.613 11.238,11.612
3D body: height 9, standoff 7, extent -11.987,-11.613 11.238,11.612
3D body: height -1.6, standoff -5.42, extent 9.144,-11.21 10.837,-9.513
3D body: height -1.6, standoff -5.42, extent -11.58,-11.21 -9.887,-9.514
3D body: height -1.6, standoff -5.42, extent 9.144,9.514 10.837,11.211
3D body: height -1.6, standoff -5.42, extent -11.58,9.514 -9.887,11.21
3D body: height -1.6, standoff -2.87, extent 7.687,-12.662 12.287,-8.062
3D body: height -1.6, standoff -2.87, extent -13.037,-12.662 -8.437,-8.062
3D body: height -1.6, standoff -2.87, extent 7.687,8.062 12.287,12.662
3D body: height -1.6, standoff -2.87, extent -13.037,8.062 -8.437,12.662
3D body: height -1.6, standoff -2.23, extent 7.587,-12.762 12.387,-7.962
3D body: height -1.6, standoff -2.23, extent 7.587,7.962 12.387,12.762
3D body: height -1.6, standoff -2.23, extent -13.137,7.962 -8.337,12.762
3D body: height -1.6, standoff -2.23, extent -13.137,-12.762 -8.337,-7.962
3D body: height 9.87, standoff 9, extent -5.375,-5 4.625,5
3D body: height 9.87, standoff 9, extent -4.375,-3.997 3.625,3.997
3D body: height 10.18, standoff 9, extent -11.531,-0.798 -9.937,0.799
3D body: height 10.18, standoff 9, extent -1.169,9.564 0.425,11.161
3D body: height 10.18, standoff 9, extent 9.193,-0.798 10.787,0.799
3D body: height 10.18, standoff 9, extent -1.169,-11.16 0.425,-9.563

## ICC_P-WFBGA153_13X11P5_P050 [mm]
pads (153):
  round 0.23 smd mask+0.05: A1(-3.25,-3.25) A2(-3.25,-2.75) A3(-3.25,-2.25) A4(-3.25,-1.75) A5(-3.25,-1.25) A6(-3.25,-0.75) A7(-3.25,-0.25) A8(-3.25,0.25) A9(-3.25,0.75) A10(-3.25,1.25) A11(-3.25,1.75) A12(-3.25,2.25) A13(-3.25,2.75) A14(-3.25,3.25) B1(-2.75,-3.25) B2(-2.75,-2.75) B3(-2.75,-2.25) B4(-2.75,-1.75) B5(-2.75,-1.25) B6(-2.75,-0.75) B7(-2.75,-0.25) B8(-2.75,0.25) B9(-2.75,0.75) B10(-2.75,1.25) B11(-2.75,1.75) B12(-2.75,2.25) B13(-2.75,2.75) B14(-2.75,3.25) C1(-2.25,-3.25) C2(-2.25,-2.75) C3(-2.25,-2.25) C4(-2.25,-1.75) C5(-2.25,-1.25) C6(-2.25,-0.75) C7(-2.25,-0.25) C8(-2.25,0.25) C9(-2.25,0.75) C10(-2.25,1.25) C11(-2.25,1.75) C12(-2.25,2.25) C13(-2.25,2.75) C14(-2.25,3.25) D1(-1.75,-3.25) D2(-1.75,-2.75) D3(-1.75,-2.25) D4(-1.75,-1.75) D12(-1.75,2.25) D13(-1.75,2.75) D14(-1.75,3.25) E1(-1.25,-3.25) E2(-1.25,-2.75) E3(-1.25,-2.25) E5(-1.25,-1.25) E6(-1.25,-0.75) E7(-1.25,-0.25) E8(-1.25,0.25) E9(-1.25,0.75) E10(-1.25,1.25) E12(-1.25,2.25) E13(-1.25,2.75) E14(-1.25,3.25) F1(-0.75,-3.25) F2(-0.75,-2.75) F3(-0.75,-2.25) F5(-0.75,-1.25) F10(-0.75,1.25) F12(-0.75,2.25) F13(-0.75,2.75) F14(-0.75,3.25) G1(-0.25,-3.25) G2(-0.25,-2.75) G3(-0.25,-2.25) G5(-0.25,-1.25) G10(-0.25,1.25) G12(-0.25,2.25) G13(-0.25,2.75) G14(-0.25,3.25) H1(0.25,-3.25) H2(0.25,-2.75) H3(0.25,-2.25) H5(0.25,-1.25) H10(0.25,1.25) H12(0.25,2.25) H13(0.25,2.75) H14(0.25,3.25) J1(0.75,-3.25) J2(0.75,-2.75) J3(0.75,-2.25) J5(0.75,-1.25) J10(0.75,1.25) J12(0.75,2.25) J13(0.75,2.75) J14(0.75,3.25) K1(1.25,-3.25) K2(1.25,-2.75) K3(1.25,-2.25) K5(1.25,-1.25) K6(1.25,-0.75) K7(1.25,-0.25) K8(1.25,0.25) K9(1.25,0.75) K10(1.25,1.25) K12(1.25,2.25) K13(1.25,2.75) K14(1.25,3.25) L1(1.75,-3.25) L2(1.75,-2.75) L3(1.75,-2.25) L12(1.75,2.25) L13(1.75,2.75) L14(1.75,3.25) M1(2.25,-3.25) M2(2.25,-2.75) M3(2.25,-2.25) M4(2.25,-1.75) M5(2.25,-1.25) M6(2.25,-0.75) M7(2.25,-0.25) M8(2.25,0.25) M9(2.25,0.75) M10(2.25,1.25) M11(2.25,1.75) M12(2.25,2.25) M13(2.25,2.75) M14(2.25,3.25) N1(2.75,-3.25) N2(2.75,-2.75) N3(2.75,-2.25) N4(2.75,-1.75) N5(2.75,-1.25) N6(2.75,-0.75) N7(2.75,-0.25) N8(2.75,0.25) N9(2.75,0.75) N10(2.75,1.25) N11(2.75,1.75) N12(2.75,2.25) N13(2.75,2.75) N14(2.75,3.25) P1(3.25,-3.25) P2(3.25,-2.75) P3(3.25,-2.25) P4(3.25,-1.75) P5(3.25,-1.25) P6(3.25,-0.75) P7(3.25,-0.25) P8(3.25,0.25) P9(3.25,0.75) P10(3.25,1.25) P11(3.25,1.75) P12(3.25,2.25) P13(3.25,2.75) P14(3.25,3.25)
Top Overlay:
  circle w0.12: c-5.975,-5.375 r0.236
  lines w0.12: -6.775,-5.125 -6.775,-6.025 -5.875,-6.025 ; -6.625,-5.875 -6.625,5.875 6.625,5.875 6.625,-5.875 -6.625,-5.875
  text "A1" at -4.55,-4.5 h1.5
Mechanical 14:
  drawing of 158 lines, arcs and shapes, not listed
  text "A1" at -3.5,-3.4 h0.5
  text "'.Designator'" at -2,-0.5 h0.75
Top Component Center:
  lines w0.01: -6.875,-6.125 -6.875,6.125 6.875,6.125 6.875,-6.125 -6.875,-6.125
3D body: height 1, standoff 0, extent -6.555,-5.805 6.555,5.805
3D body "WFBGA-153.STEP": height 0.78, standoff -0.02, extent -6.5,-5.75 6.5,5.75

## ICC_QFN40-EPAD_5X5_P040 [mm]
pads (41):
  rect 0.7x0.25 smd mask+0.025: 1(-2.45,1.8) 2(-2.45,1.4) 3(-2.45,1) 4(-2.45,0.6) 5(-2.45,0.2) 6(-2.45,-0.2) 7(-2.45,-0.6) 8(-2.45,-1) 9(-2.45,-1.4) 10(-2.45,-1.8) 21(2.45,-1.8) 22(2.45,-1.4) 23(2.45,-1) 24(2.45,-0.6) 25(2.45,-0.2) 26(2.45,0.2) 27(2.45,0.6) 28(2.45,1) 29(2.45,1.4) 30(2.45,1.8)
  rect 0.25x0.7 smd mask+0.025: 11(-1.8,-2.45) 12(-1.4,-2.45) 13(-1,-2.45) 14(-0.6,-2.45) 15(-0.2,-2.45) 16(0.2,-2.45) 17(0.6,-2.45) 18(1,-2.45) 19(1.4,-2.45) 20(1.8,-2.45) 31(1.8,2.45) 32(1.4,2.45) 33(1,2.45) 34(0.6,2.45) 35(0.2,2.45) 36(-0.2,2.45) 37(-0.6,2.45) 38(-1,2.45) 39(-1.4,2.45) 40(-1.8,2.45)
  rect 3.8x3.8 smd mask+0.05: 41(0,0)
Top Overlay:
  circle w0.12: c-2.2,2.2 r0.182
  lines w0.12: -2.5,-2.025 -2.5,-2.5 -2.025,-2.5 ; -2.5,2.025 -2.5,2.5 -2.025,2.5 ; 2.025,-2.5 2.5,-2.5 2.5,-2.025 ; 2.025,2.5 2.5,2.5 2.5,2.025
  text "1" at -2.837,2.119 h0.56
Mechanical 14:
  circle w0.01: c-2.225,2.225 r0.23
  lines w0.01: -2.5,-1.9 -2.1,-1.9 -2.1,-1.7 -2.5,-1.7 ; -2.5,-1.5 -2.1,-1.5 -2.1,-1.3 -2.5,-1.3 ; -2.5,-1.1 -2.1,-1.1 -2.1,-0.9 -2.5,-0.9 ; -2.5,-0.7 -2.1,-0.7 -2.1,-0.5 -2.5,-0.5 ; -2.5,-0.3 -2.1,-0.3 -2.1,-0.1 -2.5,-0.1 ; -2.5,0.1 -2.1,0.1 -2.1,0.3 -2.5,0.3 ; -2.5,0.5 -2.1,0.5 -2.1,0.7 -2.5,0.7 ; -2.5,0.9 -2.1,0.9 -2.1,1.1 -2.5,1.1 ; -2.5,1.3 -2.1,1.3 -2.1,1.5 -2.5,1.5 ; -2.5,1.7 -2.1,1.7 -2.1,1.9 -2.5,1.9 ; -1.9,-2.5 -1.9,-2.1 -1.7,-2.1 -1.7,-2.5 ; -1.9,2.5 -1.9,2.1 -1.7,2.1 -1.7,2.5 ; -1.5,-2.5 -1.5,-2.1 -1.3,-2.1 -1.3,-2.5 ; -1.5,2.5 -1.5,2.1 -1.3,2.1 -1.3,2.5 ; -1.1,-2.5 -1.1,-2.1 -0.9,-2.1 -0.9,-2.5 ; -1.1,2.5 -1.1,2.1 -0.9,2.1 -0.9,2.5 ; -0.7,-2.5 -0.7,-2.1 -0.5,-2.1 -0.5,-2.5 ; -0.7,2.5 -0.7,2.1 -0.5,2.1 -0.5,2.5 ; -0.3,-2.5 -0.3,-2.1 -0.1,-2.1 -0.1,-2.5 ; -0.3,2.5 -0.3,2.1 -0.1,2.1 -0.1,2.5 ; 0.1,-2.5 0.1,-2.1 0.3,-2.1 0.3,-2.5 ; 0.1,2.5 0.1,2.1 0.3,2.1 0.3,2.5 ; 0.5,-2.5 0.5,-2.1 0.7,-2.1 0.7,-2.5 ; 0.5,2.5 0.5,2.1 0.7,2.1 0.7,2.5 ; 0.9,-2.5 0.9,-2.1 1.1,-2.1 1.1,-2.5 ; 0.9,2.5 0.9,2.1 1.1,2.1 1.1,2.5 ; 1.3,-2.5 1.3,-2.1 1.5,-2.1 1.5,-2.5 ; 1.3,2.5 1.3,2.1 1.5,2.1 1.5,2.5 ; 1.7,-2.5 1.7,-2.1 1.9,-2.1 1.9,-2.5 ; 1.7,2.5 1.7,2.1 1.9,2.1 1.9,2.5 ; 2.5,-1.9 2.1,-1.9 2.1,-1.7 2.5,-1.7 ; 2.5,-1.5 2.1,-1.5 2.1,-1.3 2.5,-1.3 ; 2.5,-1.1 2.1,-1.1 2.1,-0.9 2.5,-0.9 ; 2.5,-0.7 2.1,-0.7 2.1,-0.5 2.5,-0.5 ; 2.5,-0.3 2.1,-0.3 2.1,-0.1 2.5,-0.1 ; 2.5,0.1 2.1,0.1 2.1,0.3 2.5,0.3 ; 2.5,0.5 2.1,0.5 2.1,0.7 2.5,0.7 ; 2.5,0.9 2.1,0.9 2.1,1.1 2.5,1.1 ; 2.5,1.3 2.1,1.3 2.1,1.5 2.5,1.5 ; 2.5,1.7 2.1,1.7 2.1,1.9 2.5,1.9 ; -2.5,-2.5 -2.5,2.5 2.5,2.5 2.5,-2.5 -2.5,-2.5 ; -1.85,-1.85 1.85,-1.85 1.85,1.85 -1.85,1.85 -1.85,-1.85
  text "41" at -0.225,-0.15 h0.5
  text "1" at -2.35,1.65 h0.5
  text "10" at -2.45,-1.95 h0.5
  text "11" at -1.975,-2.45 h0.5
  text "20" at 1.575,-2.45 h0.5
  text "21" at 2.05,-1.95 h0.5
  text "30" at 2,1.65 h0.5
  text "31" at 1.6,2.125 h0.5
  text "40" at -1.95,2.125 h0.5
  text "'.Designator'" at -2,-0.5 h0.75
Top Component Center:
  lines w0.01: -2.95,-2.95 2.95,-2.95 2.95,2.95 -1.95,2.95 -2.95,2.95 -2.95,-2.95
3D body: height 0.91, standoff 0.9, extent -2.248,1.751 -1.75,2.25
3D body: height 0.9, standoff 0, extent -2.5,-2.5 2.5,2.5
3D body "QFN40-5X5-P040.STEP": height 0.73, standoff -0.02, extent -2.501,-2.501 2.501,2.501
3D body: height 0.73, standoff 0.73, extent -2.5,-2.5 2.5,2.5
3D body: height 0.74, standoff 0.73, extent -2.248,1.551 -1.75,2.05

## ICC_W-CSP-BGA72_4P511X4P023_P050 [mm]
pads (72):
  round 0.25 smd mask+0.051: A1(-2,1.75) A2(-1.5,1.75) A3(-1,1.75) A4(-0.5,1.75) A5(0,1.75) A6(0.5,1.75) A7(1,1.75) A8(1.5,1.75) A9(2,1.75) B1(-2,1.25) B2(-1.5,1.25) B3(-1,1.25) B4(-0.5,1.25) B5(0,1.25) B6(0.5,1.25) B7(1,1.25) B8(1.5,1.25) B9(2,1.25) C1(-2,0.75) C2(-1.5,0.75) C3(-1,0.75) C4(-0.5,0.75) C5(0,0.75) C6(0.5,0.75) C7(1,0.75) C8(1.5,0.75) C9(2,0.75) D1(-2,0.25) D2(-1.5,0.25) D3(-1,0.25) D4(-0.5,0.25) D5(0,0.25) D6(0.5,0.25) D7(1,0.25) D8(1.5,0.25) D9(2,0.25) E1(-2,-0.25) E2(-1.5,-0.25) E3(-1,-0.25) E4(-0.5,-0.25) E5(0,-0.25) E6(0.5,-0.25) E7(1,-0.25) E8(1.5,-0.25) E9(2,-0.25) F1(-2,-0.75) F2(-1.5,-0.75) F3(-1,-0.75) F4(-0.5,-0.75) F5(0,-0.75) F6(0.5,-0.75) F7(1,-0.75) F8(1.5,-0.75) F9(2,-0.75) G1(-2,-1.25) G2(-1.5,-1.25) G3(-1,-1.25) G4(-0.5,-1.25) G5(0,-1.25) G6(0.5,-1.25) G7(1,-1.25) G8(1.5,-1.25) G9(2,-1.25) H1(-2,-1.75) H2(-1.5,-1.75) H3(-1,-1.75) H4(-0.5,-1.75) H5(0,-1.75) H6(0.5,-1.75) H7(1,-1.75) H8(1.5,-1.75) H9(2,-1.75)
Top Overlay:
  circle w0.12: c-2,1.75 r0.25
  lines w0.12: -2.425,1.75 -2.425,2.175 -2,2.175 ; -2.275,-2.031 -2.275,2.031 2.275,2.031 2.275,-2.031 -2.275,-2.031
Mechanical 20:
  lines w0.01: -2.5,-2.25 2.475,-2.25 2.475,2.25 -2.475,2.25 -2.5,2.25 -2.5,2.225 -2.5,-2.25
Mechanical 27:
  circle w0.01: c-2,1.75 r0.2
  lines w0.01: -2.275,-2.031 -2.275,2.031 2.275,2.031 2.275,-2.031 -2.275,-2.031
3D body: height 0.78, standoff 0, extent -2.28,-2.036 2.28,2.036